# Altium footprint library PBL - THD Packages.PcbLib: 200 footprints (part 10 of 13)
Each footprint in its own frame and in the unit in brackets; x right, y up, seen from the top. Pads: shape width x height; smd on the part's side, far side on the other; paste and mask are expansions set on the pad; w line width, h text height; cw(c..) or ccw(c..) is an arc to the next point about the centre after c.
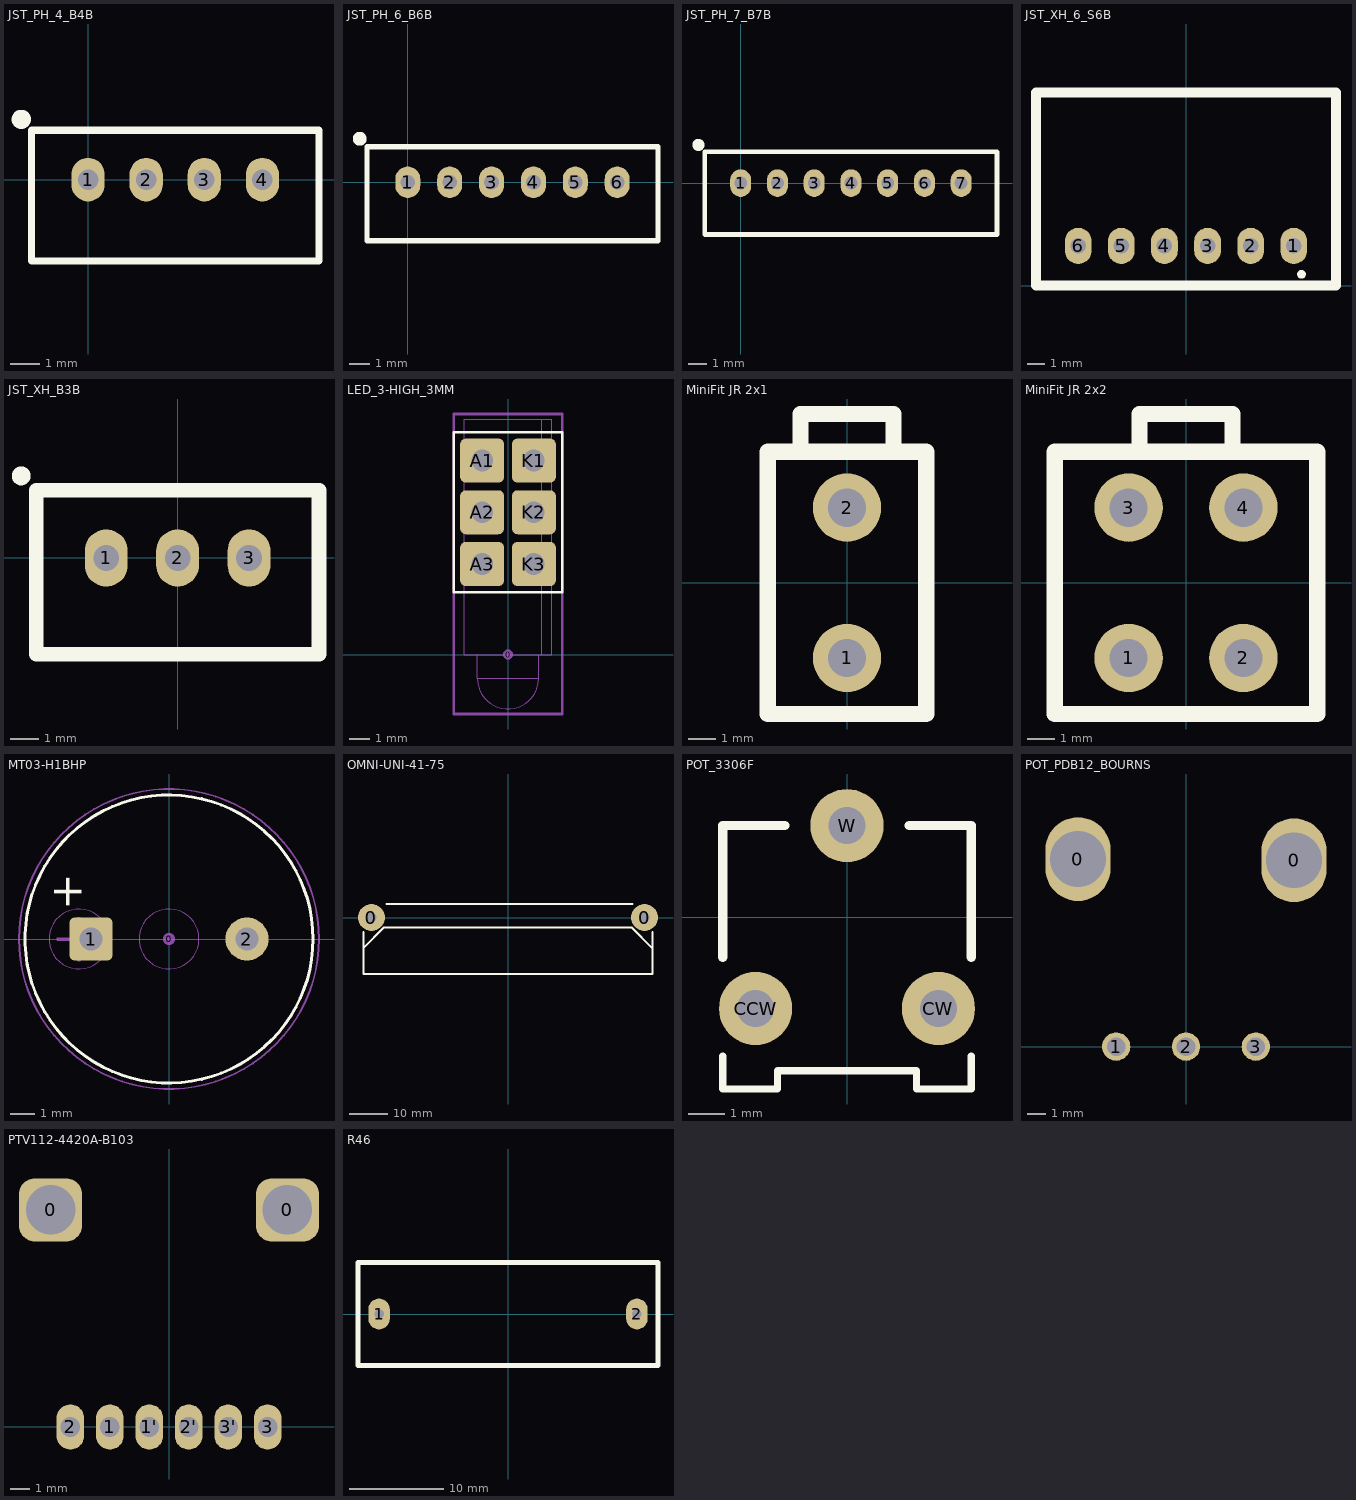
[diagram p9: the footprints below, top view; thin cyan lines are the x and y axes]

## JST_PH_4_B4B [mm]
height 6
pads (4):
  oval 1.143x1.5 hole 0.7: 1(0,0) 2(2,0) 3(4,0) 4(6,0)
Top Overlay:
  circle w0.5: c-2.3,2.075 r0.079
  lines w0.254: -1.95,-2.8 7.95,-2.8 7.95,1.7 -1.95,1.7 -1.95,-2.8
3D body "B4B-PH-K-S.STEP": height 6, standoff -3.4, extent -1.95,-2.8 7.95,1.7

## JST_PH_6_B6B [mm]
height 6
pads (6):
  oval 1.194x1.5 hole 0.7: 1(0,0) 2(2,0) 3(4,0) 4(6,0) 5(8,0) 6(10,0)
Top Overlay:
  circle w0.5: c-2.3,2.075 r0.079
  lines w0.254: -1.95,-2.8 11.95,-2.8 11.95,1.7 -1.95,1.7 -1.95,-2.8
3D body "B6B-PH-K-S.STEP": height 6, standoff -3.4, extent -1.95,-2.8 11.95,1.7

## JST_PH_7_B7B [mm]
height 6
pads (7):
  oval 1.143x1.5 hole 0.7: 1(0,0) 2(2,0) 3(4,0) 4(6,0) 5(8,0) 6(10,0) 7(12,0)
Top Overlay:
  circle w0.5: c-2.3,2.075 r0.079
  lines w0.254: -1.95,-2.8 13.95,-2.8 13.95,1.7 -1.95,1.7 -1.95,-2.8
3D body "B7B-PH-K-S.STEP": height 6, standoff -3.4, extent -1.95,-2.8 13.95,1.7

## JST_XH_6_S6B [mm]
height 6.1
pads (6):
  oval 1.55x2.1 hole 0.9: 1(6.25,2.3) 2(3.75,2.3) 3(1.25,2.3) 4(-1.25,2.3) 5(-3.75,2.3) 6(-6.25,2.3)
Top Overlay:
  circle w0.254: c6.7,0.65 r0.125
  lines w0.6: -8.7,0 8.7,0 8.7,11.2 -8.7,11.2 -8.7,0
3D body "S6B-XH-A.STEP": height 6.15, standoff -3.4, extent -8.7,0 8.7,11.5

## JST_XH_B3B [mm]
pads (3):
  oval 1.5x2 hole 0.9: 1(-2.5,0) 2(0,0) 3(2.5,0)
Top Overlay:
  circle w0.5: c-5.475,2.875 r0.079
  lines w0.508: -4.95,-3.375 4.95,-3.375 4.95,2.375 -4.95,2.375 -4.95,-3.375
3D body "B3B-XH-A.STEP": height 7, standoff -3.4, extent -4.95,-3.375 4.95,2.375

## LED_3-HIGH_3MM [mil] "LED Circuit Board Indicator Tri-Level"
height 600
pads (7):
  round 20 on Mech15: 0(0,0)
  rrect25% 85x85 hole 42: A1(-50,375) A2(-50,275) A3(-50,175) K1(50,375) K2(50,275) K3(50,175)
Top Overlay:
  lines w5: -105,120 -105,430 105,430 105,120 -105,120
13 - 3D Top Side:
  lines w1.97: -59.06,0 -59.06,-46.06 ; 59.06,0 59.06,-46.06 ; 65.35,0 65.35,455.12 ; -59.06,-46.06 ccw(c0,-46.06) 59.06,-46.06 ; -59.06,-46.06 59.06,-46.06 ; -85.04,0 -85.04,455.12 85.04,455.12 85.04,0 -85.04,0
15 - Top Courtyards:
  lines w5: -105,-115 -105,465 105,465 105,-115 -105,-115
3D body "LED bar 3-high 3mm.STEP": height 600, standoff -144.88, extent -85.04,-105.11 85.04,455.12

## MiniFit JR 2x1 [mm] "2 Positions Header, Shrouded Connector 0.165\" (4.20mm) Through Hole Tin"
height 12.7
pads (2):
  round 2.5 hole 1.4: 1(0,-2.75) 2(0,2.75)
Top Overlay:
  lines w0.6: -1.7,4.8 -1.7,6.175 1.7,6.175 1.7,4.8 ; -2.9,-4.8 2.9,-4.8 2.9,4.8 -2.9,4.8 -2.9,-4.8
3D body "039281023.stp": height 12.8, standoff -3.5, extent -3.1,-4.8 3.1,6.2

## MiniFit JR 2x2 [mm] "4 Positions Header, Shrouded Connector 0.165\" (4.20mm) Through Hole Tin"
height 12.7
pads (4):
  round 2.5 hole 1.4: 1(-2.1,-2.75) 2(2.1,-2.75) 3(-2.1,2.75) 4(2.1,2.75)
Top Overlay:
  lines w0.6: -1.7,4.8 -1.7,6.175 1.7,6.175 1.7,4.8 ; -4.8,-4.8 4.8,-4.8 4.8,4.8 -4.8,4.8 -4.8,-4.8
3D body "039281043.stp": height 12.8, standoff -3.5, extent -5.2,-4.825 5.2,6.175

## MT03-H1BHP [mm]
height 10.008
pads (3):
  round 0.508 on Mech15: 0(0,0)
  rrect25% 1.8x1.8 hole 0.965: 1(-3.25,0)
  round 1.8 hole 0.965: 2(3.25,0)
Top Overlay:
  circle w0.127: c0,0 r6
  text "+" at -3.2,1.2 h2.29
13 - 3D Top Side:
  circle w0.05: c0,0 r6.25
  circle w0.05: c-3.75,0 r1.25
  circle w0.05: c0,0 r5.996
  circle w0.05: c0,0 r1.25
  circle w0.076: c0.003,-0.012 r6
  lines w0.05: -4.65,-0.05 -4.65,0.05 ; -4.65,-0.05 -4.625,-0.025 ; -4.65,-0.05 -3.775,-0.05 ; -4.65,0.05 -4.625,0.025 ; -4.65,0.05 -3.775,0.05 ; -4.625,-0.025 -4.625,0.025 ; -4.625,-0.025 -3.8,-0.025 ; -4.625,0.025 -3.8,0.025 ; -3.8,-0.9 -3.8,-0.025 ; -3.8,-0.9 -3.775,-0.875 ; -3.8,-0.9 -3.7,-0.9 ; -3.8,-0.025 cw(c-3.8,-0.05) -3.775,-0.05 ; -3.8,0.025 ccw(c-3.8,0.05) -3.775,0.05 ; -3.8,0.025 -3.8,0.9 ; -3.8,0.9 -3.7,0.9 ; -3.8,0.9 -3.775,0.875 ; -3.775,-0.875 -3.775,-0.05 ; -3.775,-0.875 -3.725,-0.875 ; -3.775,0.05 -3.775,0.875 ; -3.775,0.875 -3.725,0.875 ; -3.725,-0.875 -3.725,-0.05 ; -3.725,-0.875 -3.7,-0.9 ; -3.725,-0.05 cw(c-3.7,-0.05) -3.7,-0.025 ; -3.725,-0.05 -2.85,-0.05 ; -3.725,0.05 ccw(c-3.7,0.05) -3.7,0.025 ; -3.725,0.05 -3.725,0.875 ; -3.725,0.05 -2.85,0.05 ; -3.725,0.875 -3.7,0.9 ; -3.7,-0.9 -3.7,-0.025 ; -3.7,-0.025 -2.875,-0.025 ; -3.7,0.025 -2.875,0.025 ; -3.7,0.025 -3.7,0.9 ; -2.875,-0.025 -2.85,-0.05 ; -2.875,-0.025 -2.875,0.025 ; -2.875,0.025 -2.85,0.05 ; -2.85,-0.05 -2.85,0.05
15 - Top Courtyards:
  circle w0.076: c0,0 r6.25
3D body "Buzzer MT03-H1BHP.STEP": height 10, standoff -2.8, extent -6.249,-6.249 6.25,6.25

## OMNI-UNI-41-75 [mm]
pads (2):
  round 7 hole 2.67: 0(-35.47,0) 0(35.47,0)
Top Overlay:
  lines w0.508: -37.5,-3.734 -37.5,-7.858 ; -31.547,3.48 32.309,3.48 ; 37.5,-3.734 37.5,-7.96 ; -37.5,-7.858 -32.242,-2.6 32.14,-2.6 37.5,-7.96 ; -37.5,-7.858 -37.5,-14.67 37.5,-14.67 37.5,-7.96
3D body "omni-uni-41-75-thermal.stp": height 63, standoff 0, extent -37.5,-14.67 37.5,26.33

## PCBComponent_1 [mil]

## PCBComponent_1 - duplicate [mil]

## POT_3306F [mm]
pads (3):
  round 2 hole 1.016: CCW(-2.5,-2.5) CW(2.5,-2.5) W(0,2.5)
Top Overlay:
  lines w0.2: -3.4,-3.8 -3.4,-4.7 -1.9,-4.7 -1.9,-4.2 0,-4.2 1.9,-4.2 1.9,-4.7 3.4,-4.7 3.4,-3.8
  lines w0.254: -3.4,-1.1 -3.4,2.5 -1.7,2.5 ; 1.7,2.5 3.4,2.5 3.4,-1.1
3D body "Trimmer, 3306F.step": height 7.62, standoff -3.04, extent -3.405,-4.876 3.405,3.79

## POT_PDB12_BOURNS [mm]
pads (5):
  oval 3.5x4.5 hole 3: 0(-5.8,10.058) 0(5.8,10)
  round 1.524 hole 1: 1(-3.75,0) 2(0,0) 3(3.75,0)
3D body "PDB12-M4251-103BF.STEP": height 25.44, standoff -2.96, extent -7.047,-0.265 7.011,16.535

## PTV112-4420A-B103 [mm] "Res Carbon Film POT 10K Ohm 20% 0.05W(1/20W) 1(Elec)/1(Mech)Turns 6mm (13 X 14.4 X 23.8mm) Pin Bracket Mount/Through Hole"
pads (8):
  rrect50% 3.2x3.2 hole 2.5: 0(-6,11) 0(6,11)
  oval 1.4x2.3 hole 1: 1(-3,0) 1'(-1,0) 2(-5,0) 2'(1,0) 3(5,0) 3'(3,0)
3D body "ptv112-3417a-xxxxx.stp": height 23.8, standoff -5, extent -7.1,-0.2 7.3,17.7

## R46 [mil]
pads (2):
  oval 90x130 hole 39.37: 1(-541.34,0) 2(541.34,0)
Top Overlay:
  lines w20: -629.92,-216.54 -629.92,216.54 629.92,216.54 629.92,-216.54 -629.92,-216.54
3D body: height 787.4, standoff 0, extent -629.92,-216.54 629.92,216.54